# Altium footprint library 0.96_OLED_2020-09-11_12-11-13.PcbLib: 1 footprints
Each footprint in its own frame and in the unit in brackets; x right, y up, seen from the top. Pads: shape width x height; smd on the part's side, far side on the other; paste and mask are expansions set on the pad; w line width, h text height; cw(c..) or ccw(c..) is an arc to the next point about the centre after c.
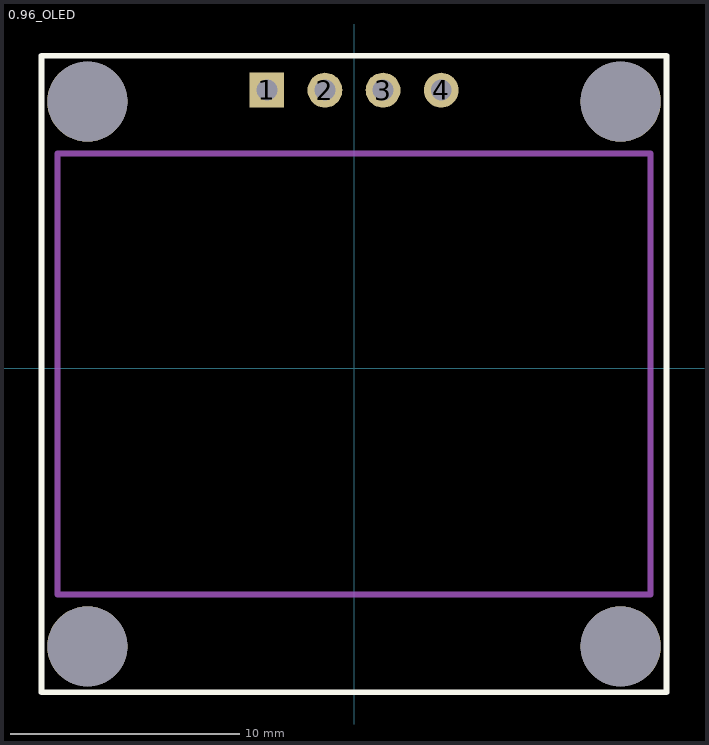
[diagram p0: the footprint, top view; thin cyan lines are the x and y axes]

## 0.96_OLED [mm]
pads (8):
  rect 1.524x1.524 hole 0.914: 1(-3.81,12.15)
  round 1.524 hole 0.914: 2(-1.27,12.15) 3(1.27,12.15) 4(3.81,12.15)
  round 3.5 hole 3.5 unplated: ""(-11.65,-12.15) ""(-11.65,11.65) ""(11.65,-12.15) ""(11.65,11.65)
Top Overlay:
  lines w0.254: -13.65,-14.15 13.65,-14.15 13.65,13.65 -13.65,13.65 -13.65,-14.15
Mechanical 15:
  lines w0.254: -12.95,-9.884 -12.95,9.384 12.95,9.384 12.95,-9.884 -12.95,-9.884